# Altium footprint library Footprints.PcbLib: 135 footprints (part 4 of 9)
Each footprint in its own frame and in the unit in brackets; x right, y up, seen from the top. Pads: shape width x height; smd on the part's side, far side on the other; paste and mask are expansions set on the pad; w line width, h text height; cw(c..) or ccw(c..) is an arc to the next point about the centre after c.
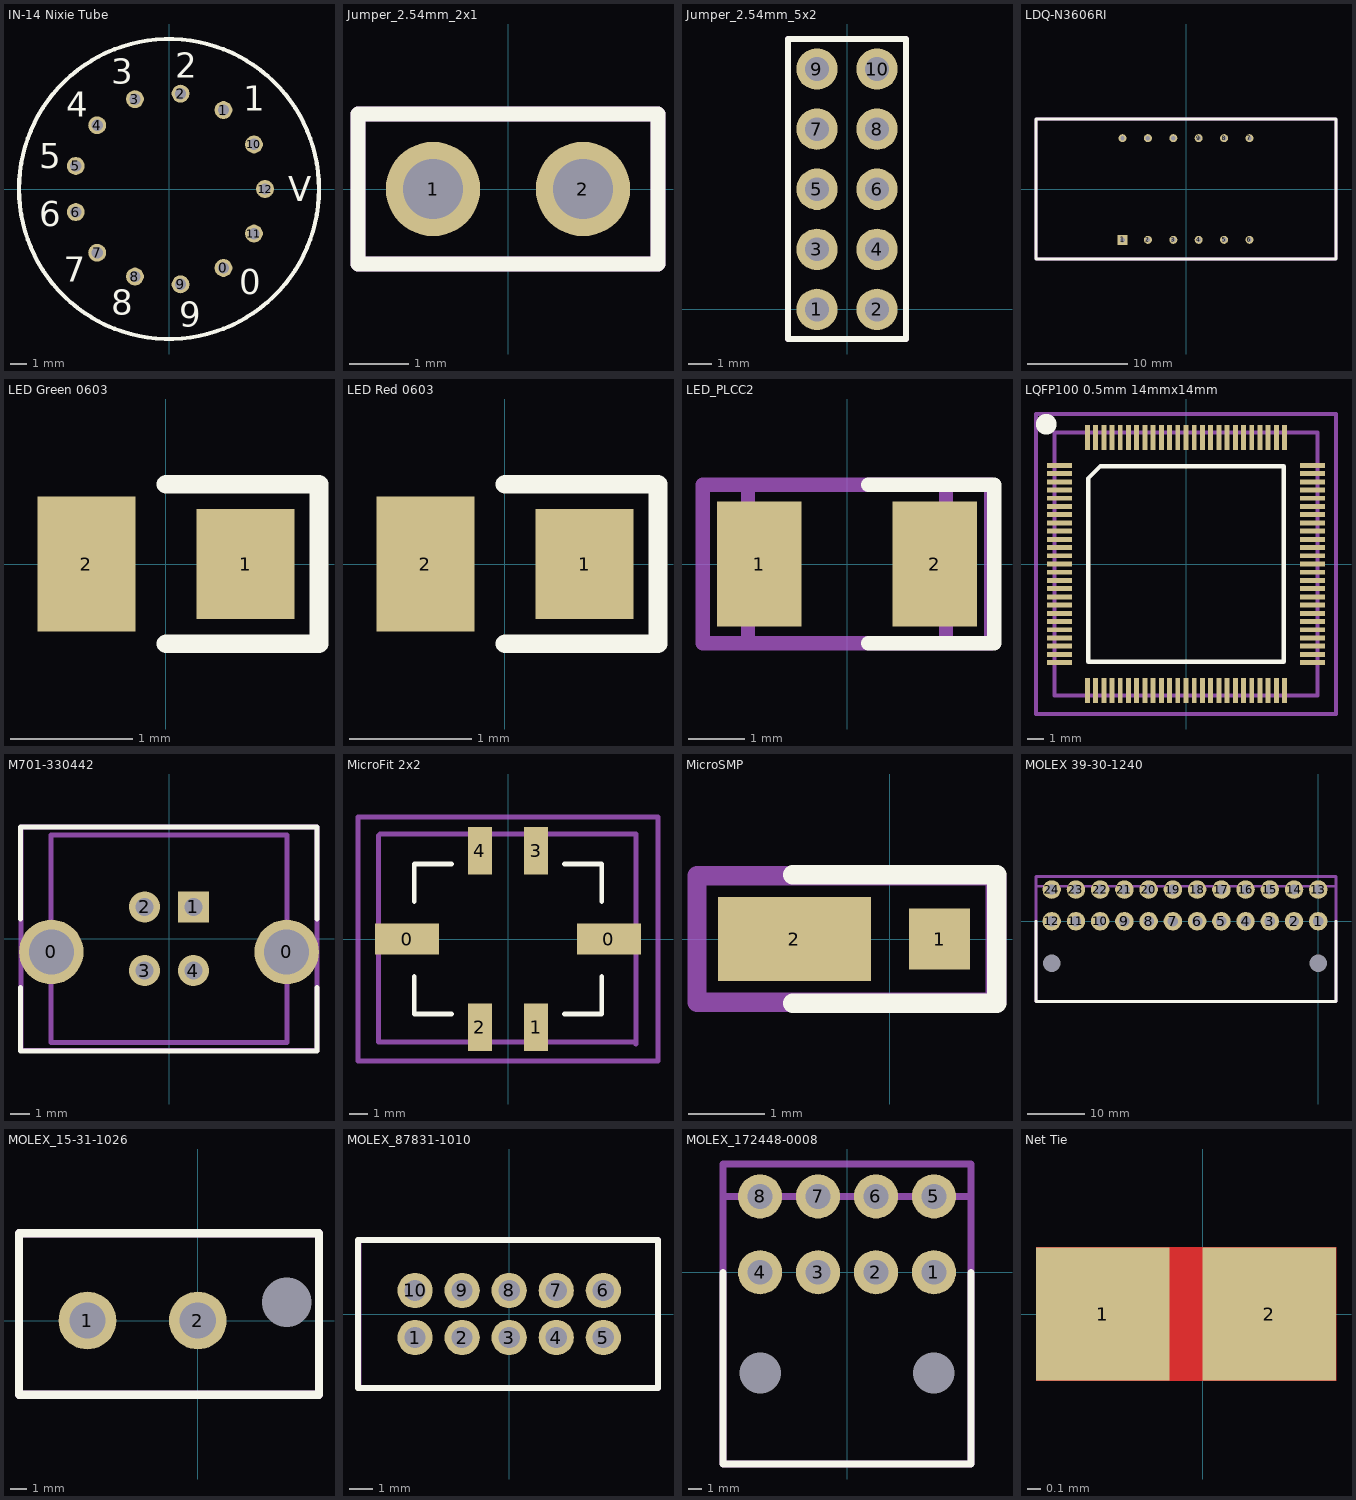
[diagram p3: the footprints below, top view; thin cyan lines are the x and y axes]

## IN-14 Nixie Tube [mm]
pads (13):
  round 1.1 hole 0.7: 0(3.36,-4.87) 1(3.36,4.87) 2(0.71,5.88) 3(-2.1,5.54) 4(-4.43,3.93) 5(-5.75,1.42) 6(-5.75,-1.42) 7(-4.43,-3.93) 8(-2.1,-5.4) 9(0.71,-5.88) 10(5.24,2.75) 11(5.24,-2.75) 12(5.92,0)
Top Overlay:
  circle w0.254: c0,0 r9.25
  text "V" at 7.366,-0.762 h1.52
  text "0" at 4.318,-6.477 h1.52
  text "1" at 4.572,4.826 h1.52
  text "2" at 0.381,6.858 h1.52
  text "3" at -3.556,6.477 h1.52
  text "8" at -3.556,-7.747 h1.52
  text "6" at -8.001,-2.286 h1.52
  text "5" at -8.001,1.27 h1.52
  text "4" at -6.35,4.445 h1.52
  text "9" at 0.635,-8.509 h1.52
  text "7" at -6.477,-5.715 h1.52
3D body: height 2, standoff -3, extent 3.112,4.621 3.61,5.12
3D body: height 2, standoff -3, extent 0.462,5.631 0.96,6.13
3D body: height 2, standoff -3, extent -2.348,5.291 -1.85,5.79
3D body: height 2, standoff -3, extent -4.678,3.681 -4.18,4.18
3D body: height 2, standoff -3, extent -5.998,1.171 -5.5,1.67
3D body: height 2, standoff -3, extent -5.998,-1.669 -5.5,-1.17
3D body: height 2, standoff -3, extent -4.678,-4.179 -4.18,-3.68
3D body: height 2, standoff -3, extent -2.348,-5.649 -1.85,-5.15
3D body: height 2, standoff -3, extent 0.462,-6.129 0.96,-5.63
3D body: height 2, standoff -3, extent 3.112,-5.119 3.61,-4.62
3D body: height 2, standoff -3, extent 4.992,-2.999 5.49,-2.5
3D body: height 2, standoff -3, extent 5.672,-0.249 6.17,0.25
3D body: height 2, standoff -3, extent 4.992,2.501 5.49,3
3D body: height 40.5, standoff 2, extent -8.433,-8.483 8.5,8.483

## Jumper_2.54mm_2x1 [mm]
height 8.51
pads (2):
  round 1.6 hole 1.02 mask+0.102: 1(-1.27,0) 2(1.27,0)
Top Overlay:
  lines w0.254: -2.54,-1.27 2.54,-1.27 2.54,1.27 -2.54,1.27 -2.54,-1.27
Mechanical 13:
  lines w0.254: -2.54,-1.27 2.54,-1.27 2.54,1.27 -2.54,1.27 -2.54,-1.27
Mechanical 15:
  lines w0.254: -2.54,-1.27 2.54,-1.27 2.54,1.27 -2.54,1.27 -2.54,-1.27
3D body: height 18.66, standoff -3.7, extent -2.54,-1.27 2.54,1.27

## Jumper_2.54mm_5x2 [mm]
height 7.54
pads (10):
  round 1.75 hole 1 mask+0.102: 1(-1.27,0) 2(1.27,0) 3(-1.27,2.54) 4(1.27,2.54) 5(-1.27,5.08) 6(1.27,5.08) 7(-1.27,7.62) 8(1.27,7.62) 9(-1.27,10.16) 10(1.27,10.16)
Top Overlay:
  lines w0.254: -2.5,-1.25 2.5,-1.25 2.5,11.43 -2.5,11.43 -2.5,-1.25
Mechanical 13:
  lines w0.254: -2.5,-1.25 -2.5,11.43 2.5,11.43 2.5,-1.25 -2.5,-1.25
Mechanical 15:
  lines w0.254: -2.5,-1.25 -2.5,11.43 2.5,11.43 2.5,-1.25 -2.5,-1.25
3D body: height 7.54, standoff -3, extent -1.667,-0.399 -0.87,0.399
3D body: height 7.54, standoff -3, extent 0.873,-0.399 1.67,0.399
3D body: height 7.54, standoff -3, extent -1.667,2.141 -0.87,2.939
3D body: height 7.54, standoff -3, extent 0.873,2.141 1.67,2.939
3D body: height 7.54, standoff -3, extent -1.667,4.681 -0.87,5.479
3D body: height 7.54, standoff -3, extent 0.873,4.681 1.67,5.479
3D body: height 7.54, standoff -3, extent -1.667,7.221 -0.87,8.019
3D body: height 7.54, standoff -3, extent 0.873,7.221 1.67,8.019
3D body: height 7.54, standoff -3, extent -1.667,9.761 -0.87,10.559
3D body: height 7.54, standoff -3, extent 0.873,9.761 1.67,10.559
3D body: height 8.25, standoff -2.35, extent -2.54,-1.27 2.54,11.43

## LDQ-N3606RI [mm] "4 Digit - 7 Segment Display"
height 7.2
pads (12):
  rect 1x1 hole 0.5 mask+0.102: 1(-6.35,-5.08)
  round 0.8 hole 0.45 mask+0.102: 2(-3.81,-5.08) 3(-1.27,-5.08) 4(1.27,-5.08) 5(3.81,-5.08) 6(6.35,-5.08) 7(6.35,5.08) 8(3.81,5.08) 9(1.27,5.08) 10(-1.27,5.08) 11(-3.81,5.08) 12(-6.35,5.08)
Top Overlay:
  lines w0.254: -15,-7 15,-7 15,7 -15,7 -15,-7
Mechanical 13:
  lines w0.254: -15,-7 15,-7 15,7 -15,7 -15,-7
Mechanical 15:
  lines w0.254: -15,-7 15,-7 15,7 -1,7 -15,7 -15,-7
3D body: height 5.8, standoff -5.7, extent -16,-5.05 16,5.05

## LED Green 0603 [mm] "LED Green 0603"
height 0.3
pads (2):
  rect 0.8x0.9 smd: 1(0.65,0)
  rect 0.8x1.1 smd: 2(-0.65,0)
Top Overlay:
  lines w0.152: 0,-0.65 1.25,-0.65 1.25,0.65 0,0.65
3D body: height 0.3, standoff 0.01, extent -0.508,-0.381 0.508,0.381
3D body: height 0.2, standoff 0, extent -0.8,-0.4 0.8,0.4

## LED Red 0603 [mm] "LED Red 0603"
height 0.3
pads (2):
  rect 0.8x0.9 smd: 1(0.65,0)
  rect 0.8x1.1 smd: 2(-0.65,0)
Top Overlay:
  lines w0.152: 0,-0.65 1.25,-0.65 1.25,0.65 0,0.65
3D body: height 0.3, standoff 0.01, extent -0.508,-0.381 0.508,0.381
3D body: height 0.2, standoff 0, extent -0.8,-0.4 0.8,0.4

## LED_PLCC2 [mm] "3.2mm x 2.8mm Kingbright LED"
height 1.9
pads (2):
  rect 1.5x2.2 smd mask+0.102: 1(-1.55,0) 2(1.55,0)
Top Overlay:
  lines w0.254: 0.375,-1.4 2.6,-1.4 2.6,1.4 0.375,1.4
Mechanical 13:
  lines w0.254: -1.75,1.35 -1.75,-1.4 1.75,-1.4 1.75,1.4 -1.75,1.4
Mechanical 15:
  lines w0.254: -2.55,-1.4 2.55,-1.4 2.55,1.4 -2.55,1.4 -2.55,-1.4
3D body: height 1.7, standoff 0.05, extent -1.75,-1.35 1.75,1.45

## LQFP100 0.5mm 14mmx14mm [mm]
height 1.75
pads (100):
  rect 1.5x0.3 smd: 1(-7.7,6) 2(-7.7,5.5) 3(-7.7,5) 4(-7.7,4.5) 5(-7.7,4) 6(-7.7,3.5) 7(-7.7,3) 8(-7.7,2.5) 9(-7.7,2) 10(-7.7,1.5) 11(-7.7,1) 12(-7.7,0.5) 13(-7.7,0) 14(-7.7,-0.5) 15(-7.7,-1) 16(-7.7,-1.5) 17(-7.7,-2) 18(-7.7,-2.5) 19(-7.7,-3) 20(-7.7,-3.5) 21(-7.7,-4) 22(-7.7,-4.5) 23(-7.7,-5) 24(-7.7,-5.5) 25(-7.7,-6) 51(7.7,-6) 52(7.7,-5.5) 53(7.7,-5) 54(7.7,-4.5) 55(7.7,-4) 56(7.7,-3.5) 57(7.7,-3) 58(7.7,-2.5) 59(7.7,-2) 60(7.7,-1.5) 61(7.7,-1) 62(7.7,-0.5) 63(7.7,0) 64(7.7,0.5) 65(7.7,1) 66(7.7,1.5) 67(7.7,2) 68(7.7,2.5) 69(7.7,3) 70(7.7,3.5) 71(7.7,4) 72(7.7,4.5) 73(7.7,5) 74(7.7,5.5) 75(7.7,6)
  rect 0.3x1.5 smd: 26(-6,-7.7) 27(-5.5,-7.7) 28(-5,-7.7) 29(-4.5,-7.7) 30(-4,-7.7) 31(-3.5,-7.7) 32(-3,-7.7) 33(-2.5,-7.7) 34(-2,-7.7) 35(-1.5,-7.7) 36(-1,-7.7) 37(-0.5,-7.7) 38(0,-7.7) 39(0.5,-7.7) 40(1,-7.7) 41(1.5,-7.7) 42(2,-7.7) 43(2.5,-7.7) 44(3,-7.7) 45(3.5,-7.7) 46(4,-7.7) 47(4.5,-7.7) 48(5,-7.7) 49(5.5,-7.7) 50(6,-7.7) 76(6,7.7) 77(5.5,7.7) 78(5,7.7) 79(4.5,7.7) 80(4,7.7) 81(3.5,7.7) 82(3,7.7) 83(2.5,7.7) 84(2,7.7) 85(1.5,7.7) 86(1,7.7) 87(0.5,7.7) 88(0,7.7) 89(-0.5,7.7) 90(-1,7.7) 91(-1.5,7.7) 92(-2,7.7) 93(-2.5,7.7) 94(-3,7.7) 95(-3.5,7.7) 96(-4,7.7) 97(-4.5,7.7) 98(-5,7.7) 99(-5.5,7.7) 100(-6,7.7)
Top Overlay:
  circle w1: c-8.5,8.5 r0.125
  lines w0.254: -5.95,-5.95 -5.95,5.2 -5.2,5.95 5.95,5.95 5.95,-5.95 -5.95,-5.95
Mechanical 13:
  lines w0.254: -8,-8 8,-8 8,8 -8,8 -8,-8
Mechanical 15:
  lines w0.254: -9.125,-9.125 -9.125,9.125 9.125,9.125 9.125,-9.125 -9.125,-9.125
3D body: height 1.6, standoff 0, extent -8,-7.999 8,8.001

## M701-330442 [mm] "Vertical Boardmount USB Connector"
height 16.25
pads (6):
  round 3.3 hole 2.3 mask+0.102: 0(-6.02,-0.675) 0(6.02,-0.675)
  rect 1.6x1.6 hole 0.92 mask+0.102: 1(1.25,1.625)
  round 1.6 hole 0.92 mask+0.102: 2(-1.25,1.625) 3(-1.25,-1.625) 4(1.25,-1.625)
Top Overlay:
  lines w0.254: -7.6,-2.5 -7.6,-5.75 7.575,-5.75 7.575,-2.5 ; -7.6,1 -7.6,5.725 7.575,5.725 7.575,1
Mechanical 13:
  lines w0.254: -6.025,-5.3 6.025,-5.3 6.025,5.3 -6.025,5.3 -6.025,-5.3
Mechanical 15:
  lines w0.254: -7.575,-5.725 7.575,-5.725 7.575,5.725 -7.575,5.725 -7.575,-5.725
3D body: height 15.82, standoff -3.82, extent -7.575,-5.728 7.575,5.728

## MicroFit 2x2 [mm]
height 9.9
pads (6):
  rect 3.43x1.65 smd: 0(-5.385,0) 0(5.385,0)
  rect 1.27x2.54 smd: 1(1.5,-4.7) 2(-1.5,-4.7) 3(1.5,4.7) 4(-1.5,4.7)
Top Overlay:
  lines w0.254: -5,-2 -5,-4 -3,-4 ; -5,2 -5,4 -3,4 ; 3,-4 5,-4 5,-2 ; 3,4 5,4 5,2
Mechanical 13:
  lines w0.254: -6.9,-5.5 6.725,-5.5 6.825,-5.6 6.825,5.6 -6.825,5.6 -6.9,5.525 -6.9,-5.5
Mechanical 15:
  lines w0.254: -7.9,-6.5 -8,-6.5 ; -8,-6.5 8,-6.5 8,6.5 -8,6.5 -8,-6.5
3D body: height 9.95, standoff -0.01, extent -6.825,-5.6 6.825,5.6

## MicroSMP [mm]
height 0.73
pads (2):
  rect 0.8x0.8 smd mask+0.102: 1(0.65,0)
  rect 2x1.1 smd mask+0.102: 2(-1.25,0)
Top Overlay:
  lines w0.254: -1.27,-0.838 1.397,-0.838 1.397,0.838 -1.27,0.838
Mechanical 13:
  lines w0.254: -2.525,-0.825 -2.525,0.825 1.375,0.825 1.375,-0.825 -2.525,-0.825
Mechanical 15:
  lines w0.254: -2.525,-0.825 1.4,-0.825 1.4,0.825 -2.525,0.825 -2.525,-0.825
3D body: height 1.35, standoff 0, extent -2.5,-1.101 1.35,1.052

## MOLEX 39-30-1240 [mm] "Connector for ATX power supply"
height 9.6
pads (26):
  round 0 hole 3 mask+0.102: 0(-46.2,-7.3) 0(0,-7.3)
  round 3.2 hole 1.8 mask+0.102: 1(0,0) 2(-4.2,0) 3(-8.4,0) 4(-12.6,0) 5(-16.8,0) 6(-21,0) 7(-25.2,0) 8(-29.4,0) 9(-33.6,0) 10(-37.8,0) 11(-42,0) 12(-46.2,0) 13(0,5.5) 14(-4.2,5.5) 15(-8.4,5.5) 16(-12.6,5.5) 17(-16.8,5.5) 18(-21,5.5) 19(-25.2,5.5) 20(-29.4,5.5) 21(-33.6,5.5) 22(-37.8,5.5) 23(-42,5.5) 24(-46.2,5.5)
Top Overlay:
  lines w0.508: -48.92,0 -48.92,-13.868 3.073,-13.868 3.073,0
Mechanical 13:
  lines w0.508: -48.895,-13.868 3.073,-13.868 3.073,6.071 -48.895,6.071 -48.895,-13.843
Mechanical 15:
  lines w0.508: -48.92,-13.868 3.073,-13.868 3.073,7.722 -48.92,7.722 -48.92,-13.868
3D body: height 11.4, standoff -3.6, extent -48.901,-13.854 3.099,6.081

## MOLEX_15-31-1026 [mm]
height 15
pads (3):
  round 0 hole 3 mask+0.102: 0(5.4,1.1)
  round 3.5 hole 2.2 mask+0.102: 1(-6.7,0) 2(0,0)
Top Overlay:
  lines w0.508: -10.85,-4.5 7.35,-4.5 7.35,5.3 -10.85,5.3 -10.85,-4.5
Mechanical 1:
  lines w0.508: 7.35,5.3 7.35,5.3 ; 7.35,5.3 7.35,5.3 ; 7.35,-4.5 7.35,-4.5
Mechanical 13:
  lines w0.508: -10.85,-4.5 7.35,-4.5 7.35,5.3 -10.85,5.3 -10.85,-4.5
Mechanical 15:
  lines w0.508: -10.85,-4.5 -10.85,5.3 7.35,5.3 7.35,-4.5 -10.85,-4.5
3D body: height 15, standoff -3.8, extent -10.85,-4.5 7.35,5.3

## MOLEX_87831-1010 [mm] "Boardmount Receptacle for 2x5 IDC Header"
height 6.4
pads (10):
  round 1.5 hole 0.9: 1(-4,-1) 2(-2,-1) 3(0,-1) 4(2,-1) 5(4,-1) 6(4,1) 7(2,1) 8(0,1) 9(-2,1) 10(-4,1)
Top Overlay:
  lines w0.254: -6.426,-3.15 -6.426,3.15 6.325,3.15 6.325,-3.15 -6.426,-3.15
Mechanical 13:
  lines w0.254: -6.401,-3.15 -6.401,3.15 6.325,3.15 6.325,-3.15 -6.401,-3.15
3D body: height 6.5, standoff -3.4, extent -6.35,-3.175 6.3,3.125

## MOLEX_172448-0008 [mm]
height 9.6
pads (10):
  round 0 hole 3 mask+0.102: 0(-6.3,-7.3) 0(6.3,-7.3)
  round 3.2 hole 1.8 mask+0.102: 1(6.3,0) 2(2.1,0) 3(-2.1,0) 4(-6.3,0) 5(6.3,5.5) 6(2.1,5.5) 7(-2.1,5.5) 8(-6.3,5.5)
Top Overlay:
  lines w0.508: -9,0 -9,-13.9 9,-13.9 9,0
Mechanical 13:
  lines w0.508: -9,-13.9 -9,0 -9,5.5 9,5.5 9,-13.9 -9,-13.9
Mechanical 15:
  lines w0.508: -9,-13.9 -9,7.85 9,7.85 9,-13.9 -9,-13.9
3D body: height 9.6, standoff 0, extent -9,-13.9 9,0

## Net Tie [mm]
pads (2):
  rect 1x1 smd mask+0.102: 1(-0.75,0) 2(0.5,0)
Top Layer:
  region: 1,0.5 1,-0.5 -1.25,-0.5 -1.25,0.5
Top Solder:
  rectangle: -0.3,-0.6 0.1,0.6